# Altium footprint library 核心板封装库.PcbLib: 1 footprints
Each footprint in its own frame and in the unit in brackets; x right, y up, seen from the top. Pads: shape width x height; smd on the part's side, far side on the other; paste and mask are expansions set on the pad; w line width, h text height; cw(c..) or ccw(c..) is an arc to the next point about the centre after c.
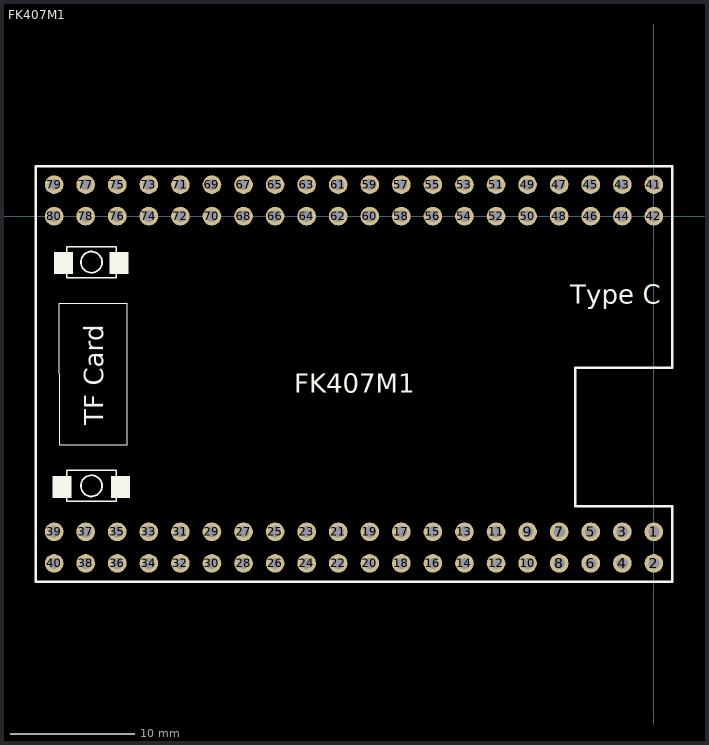
[diagram p0: the footprint, top view; thin cyan lines are the x and y axes]

## FK407M1 [mm]
pads (80):
  round 1.5 hole 0.9: 1(0,-25.4) 2(0,-27.94) 3(-2.54,-25.4) 4(-2.54,-27.94) 5(-5.08,-25.4) 6(-5.08,-27.94) 7(-7.62,-25.4) 8(-7.62,-27.94) 9(-10.16,-25.4) 10(-10.16,-27.94) 11(-12.7,-25.4) 12(-12.7,-27.94) 13(-15.24,-25.4) 14(-15.24,-27.94) 15(-17.78,-25.4) 16(-17.78,-27.94) 17(-20.32,-25.4) 18(-20.32,-27.94) 19(-22.86,-25.4) 20(-22.86,-27.94) 21(-25.4,-25.4) 22(-25.4,-27.94) 23(-27.94,-25.4) 24(-27.94,-27.94) 25(-30.48,-25.4) 26(-30.48,-27.94) 27(-33.02,-25.4) 28(-33.02,-27.94) 29(-35.56,-25.4) 30(-35.56,-27.94) 31(-38.1,-25.4) 32(-38.1,-27.94) 33(-40.64,-25.4) 34(-40.64,-27.94) 35(-43.18,-25.4) 36(-43.18,-27.94) 37(-45.72,-25.4) 38(-45.72,-27.94) 39(-48.26,-25.4) 40(-48.26,-27.94) 41(0,2.54) 42(0,0) 43(-2.54,2.54) 44(-2.54,0) 45(-5.08,2.54) 46(-5.08,0) 47(-7.62,2.54) 48(-7.62,0) 49(-10.16,2.54) 50(-10.16,0) 51(-12.7,2.54) 52(-12.7,0) 53(-15.24,2.54) 54(-15.24,0) 55(-17.78,2.54) 56(-17.78,0) 57(-20.32,2.54) 58(-20.32,0) 59(-22.86,2.54) 60(-22.86,0) 61(-25.4,2.54) 62(-25.4,0) 63(-27.94,2.54) 64(-27.94,0) 65(-30.48,2.54) 66(-30.48,0) 67(-33.02,2.54) 68(-33.02,0) 69(-35.56,2.54) 70(-35.56,0) 71(-38.1,2.54) 72(-38.1,0) 73(-40.64,2.54) 74(-40.64,0) 75(-43.18,2.54) 76(-43.18,0) 77(-45.72,2.54) 78(-45.72,0) 79(-48.26,2.54) 80(-48.26,0)
Top Overlay:
  circle w0.15: c-45.259,-21.7 r0.85
  circle w0.15: c-45.259,-3.7 r0.85
  rectangle: -48.26,-4.648 -46.736,-2.87
  rectangle: -43.815,-4.648 -42.291,-2.87
  rectangle: -48.387,-22.682 -46.863,-20.904
  rectangle: -43.688,-22.682 -42.164,-20.904
  lines w0.1: -47.879,-7.002 -47.864,-18.396 -42.389,-18.396 -42.389,-7.002 -47.879,-7.002
  lines w0.127: -47.259,-22.95 -47.259,-20.45 -43.259,-20.45 -43.259,-22.95 -47.259,-22.95 ; -47.259,-4.95 -43.259,-4.95 -43.259,-2.45 -47.259,-2.45 -47.259,-4.95
  lines w0.203: -49.733,-29.413 1.473,-29.413 1.473,-23.358 -6.321,-23.358 -6.321,-12.182 1.473,-12.182 1.473,4.013 -49.733,4.013 -49.733,-29.413
  text "FK407M1" at -28.956,-14.224 h1.52
  text "TF Card" at -44.323,-16.84 h1.52
  text "Type C" at -6.731,-7.061 h1.52